# Altium footprint library boxer_ic.PcbLib: 42 footprints (part 1 of 3)
Each footprint in its own frame and in the unit in brackets; x right, y up, seen from the top. Pads: shape width x height; smd on the part's side, far side on the other; paste and mask are expansions set on the pad; w line width, h text height; cw(c..) or ccw(c..) is an arc to the next point about the centre after c.
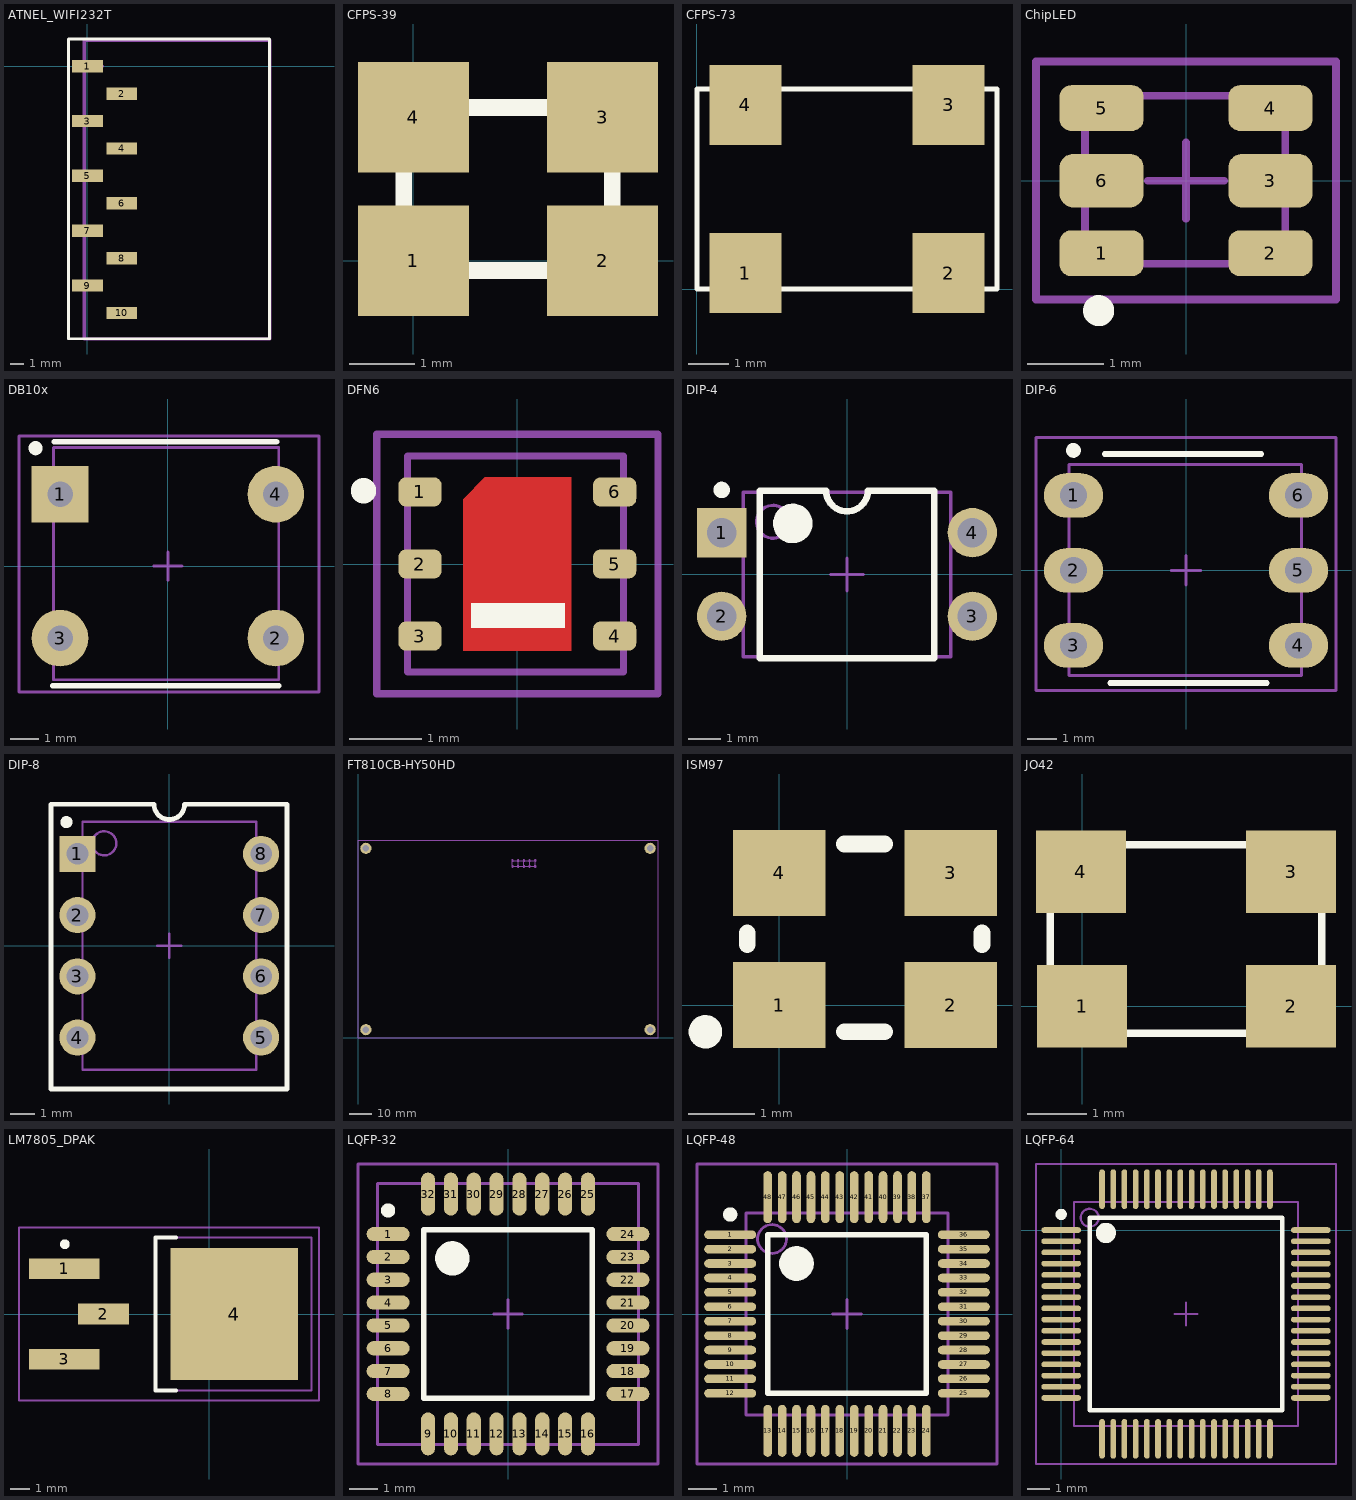
[diagram p0: the footprints below, top view; thin cyan lines are the x and y axes]

## ATNEL_WIFI232T [mm]
height 6
pads (10):
  rect 2.25x0.9 smd: 1(0,0) 2(2.515,-2) 3(0,-4) 4(2.515,-6) 5(0,-8) 6(2.515,-10) 7(0,-12) 8(2.515,-14) 9(0,-16) 10(2.515,-18)
Top Overlay:
  lines w0.2: -1.376,-19.888 13.28,-19.888 13.28,1.981 -1.376,1.981 -1.376,-19.888
Mechanical 13:
  lines w0.2: -0.212,0 1.118,0
  lines w0.254: -0.212,-16.002 -0.212,-19.9 ; -0.212,-19.9 13.288,-19.9 13.288,1.9 -0.212,1.9 -0.212,-19.9
3D body "mill-max-830-10-010-30-001000.STEP": height 8.61, standoff 0.2, extent -1.009,-18.928 3.429,1.072

## CFPS-39 [mm]
pads (4):
  rect 1.7x1.7 smd: 1(0,0) 2(2.9,0) 3(2.9,2.2) 4(0,2.2)
Top Overlay:
  circle w0.254: c-0.549,-0.513 r0.127
  lines w0.254: -0.15,-0.15 -0.15,2.35 3.05,2.35 3.05,-0.15 -0.15,-0.15
3D body: height 1.75, standoff 0, extent -0.152,-0.152 3.048,2.362

## CFPS-73 [mm]
pads (4):
  rect 1.8x2 smd: 1(1.219,0.406) 2(6.299,0.406) 3(6.299,4.606) 4(1.219,4.606)
Top Overlay:
  lines w0.127: 0.009,0.006 7.509,0.006 7.509,5.006 0.009,5.006 0.009,0.006

## ChipLED [mm]
height 1.5
pads (6):
  rrect50% 1.1x0.6 smd: 1(-1.105,-0.95) 2(1.105,-0.95) 4(1.105,0.95) 5(-1.105,0.95)
  rrect50% 1.1x0.7 smd: 3(1.105,0) 6(-1.105,0)
Top Overlay:
  circle w0.254: c-1.143,-1.702 r0.076
Mechanical 13:
  lines w0.1: -1.323,-1.09 -1.323,1.11 1.297,1.11 1.297,-1.09 -1.323,-1.09
  text ".Designator" at -1.27,1.448 h0.5
  text ".Value" at -0.914,-1.854 h0.5
Mechanical 15:
  lines w0.1: -0.5,0 0.5,0 ; 0,-0.5 0,0.5 ; -1.964,-1.555 1.964,-1.555 1.964,1.56 -1.964,1.56 -1.964,-1.555
3D body "User Library-APDS-9301.step": height -0.38, standoff -0.94, extent -1.323,-1.09 1.297,1.11

## DB10x [mm]
height 5.46
pads (4):
  rect 2x2 hole 0.9: 1(-3.81,2.54)
  round 2 hole 0.9: 2(3.81,-2.54) 3(-3.81,-2.54) 4(3.81,2.54)
Top Overlay:
  circle w0.25: c-4.674,4.166 r0.125
  lines w0.2: -4.064,-4.216 3.912,-4.216 ; -4.013,4.394 -0.635,4.394 3.835,4.394
Mechanical 13:
  lines w0.1: -4.039,-4.013 -4.039,4.191 3.912,4.191 3.912,-4.013 -4.039,-4.013
  text ".Value" at -0.965,-0.178 h0.5
  text ".Designator" at -3.958,4.563 h0.5
Mechanical 15:
  lines w0.1: -0.5,0 0.5,0 ; 0,-0.5 0,0.5 ; -5.258,-4.445 5.334,-4.445 5.334,4.597 -5.258,4.597 -5.258,-4.445
3D body "User Library-Silicon Bridge Rectifiers DF01.step": height 3.35, standoff -3.46, extent -4.008,-3.998 3.912,4.202

## DFN6 [mm] "body 3x3mm"
height 2
pads (6):
  rrect50% 0.6x0.4 smd: 1(-1.35,1) 2(-1.35,0) 3(-1.35,-1) 4(1.35,-1) 5(1.35,0) 6(1.35,1)
Top Layer:
  region: 0.75,-1.2 -0.75,-1.2 -0.75,0.9 -0.45,1.2 0.75,1.2
Top Overlay:
  circle w0.2: c-2.134,1.016 r0.076
  rectangle: -0.64,-0.889 0.66,-0.539
Mechanical 13:
  lines w0.1: -1.524,-1.499 -1.524,1.499 1.473,1.499 1.473,-1.499 -1.524,-1.499
  text ".Value" at -0.991,-2.21 h0.5
  text ".Designator" at -1.549,1.829 h0.5
Mechanical 15:
  lines w0.1: -0.5,0 0.5,0 ; 0,-0.5 0,0.5 ; -1.951,-1.799 -1.951,1.799 1.951,1.799 1.951,-1.799 -1.951,-1.799
3D body "User Library-SHT25.step": height 1, standoff 0, extent -1.501,-1.499 1.499,1.501

## DIP-4 [mm] "DIP; 4 Leads; Row Spacing 7.62 mm; Pitch 2.54 mm"
height 5.6
pads (4):
  rect 1.5x1.5 hole 0.9: 1(-3.81,1.27)
  round 1.5 hole 0.9: 2(-3.81,-1.27) 3(3.81,-1.27) 4(3.81,1.27)
Top Overlay:
  circle w0.25: c-3.81,2.57 r0.125
  circle w0.6: c-1.65,1.55 r0.3
  lines w0.2: -2.65,-2.55 -2.65,2.55 -0.635,2.55 ccw(c0,2.55) 0.635,2.55 2.65,2.55 2.65,-2.55 -2.65,-2.55
Mechanical 13:
  circle w0.1: c-2.25,1.6 r0.5
  lines w0.1: -3.15,-2.5 -3.15,2.5 3.15,2.5 3.15,-2.5 -3.15,-2.5
Mechanical 15:
  lines w0.1: -0.5,0 0.5,0 ; 0,-0.5 0,0.5
3D body "CircuitWorks-DIP4.step": height 4.31, standoff -3.28, extent -4,-2.769 4,2.771

## DIP-6 [mm] "DIP; 6 Leads; Row Spacing 7.62 mm; Pitch 2.54 mm"
height 5.46
pads (6):
  oval 2x1.5 hole 0.9: 1(-3.81,2.54) 2(-3.81,0) 3(-3.81,-2.54) 4(3.81,-2.54) 5(3.81,0) 6(3.81,2.54)
Top Overlay:
  circle w0.25: c-3.81,4.064 r0.125
  lines w0.2: -2.752,3.937 0.533,3.937 2.548,3.937 ; -2.565,-3.81 2.735,-3.81
Mechanical 13:
  lines w0.1: -3.962,-3.556 -3.962,3.581 3.912,3.581 3.912,-3.556 -3.962,-3.556
Mechanical 15:
  lines w0.1: -0.5,0 0.5,0 ; 0,-0.5 0,0.5 ; -5.08,-4.064 5.08,-4.064 5.08,4.496 -5.08,4.496 -5.08,-4.064
3D body "User Library-DIP6-White.STEP": height 4.4, standoff -2.9, extent -3.96,-3.531 3.91,3.589

## DIP-8 [mm] "DIP; 8 Leads; Row Spacing 7.62 mm; Pitch 2.54 mm"
height 5.08
pads (8):
  rect 1.5x1.5 hole 0.9: 1(-3.81,3.81)
  round 1.5 hole 0.9: 2(-3.81,1.27) 3(-3.81,-1.27) 4(-3.81,-3.81) 5(3.81,-3.81) 6(3.81,-1.27) 7(3.81,1.27) 8(3.81,3.81)
Top Overlay:
  circle w0.25: c-4.267,5.131 r0.125
  lines w0.2: -4.902,-5.944 4.877,-5.944 4.877,5.867 0.635,5.867 cw(c0,5.867) -0.635,5.867 -4.902,5.867 -4.902,-5.944
Mechanical 13:
  circle w0.1: c-2.7,4.25 r0.5
  lines w0.1: -3.6,-5.15 3.6,-5.15 3.6,5.15 -3.6,5.15 -3.6,-5.15
Mechanical 15:
  lines w0.1: -0.5,0 0.5,0 ; 0,-0.5 0,0.5
3D body "CircuitWorks-DIP8.step": height 4.19, standoff -2.67, extent -3.912,-5.715 3.962,5.715

## FT810CB-HY50HD [mm]
height 10
pads (4):
  round 5 hole 3: MH1(130.5,3.5) MH2(130.5,84.5) MH3(3.5,3.5) MH4(3.5,84.5)
Mechanical 1:
  circle w0.1: c79.16,76.46 r0.368
  circle w0.1: c76.62,76.46 r0.368
  circle w0.1: c74.08,76.46 r0.368
  circle w0.1: c71.54,76.46 r0.368
  circle w0.1: c69,76.46 r0.368
  circle w0.1: c69,79 r0.368
  circle w0.1: c71.54,79 r0.368
  circle w0.1: c74.08,79 r0.368
  circle w0.1: c76.62,79 r0.368
  circle w0.1: c79.16,79 r0.368
  lines w0.1: 0,79 0,88 ; 71.54,76.46 71.54,79 ; 74.08,76.46 74.08,79 ; 76.62,76.46 76.62,79 ; 0,88 134,88 134,0 0,0 0,88 ; 69,76.46 69,79 79.16,79 79.16,76.46 69,76.46

## ISM97 [mm]
pads (4):
  rect 1.4x1.3 smd: 1(0,0) 2(2.6,0) 3(2.6,2) 4(0,2)
Top Overlay:
  circle w0.254: c-1.118,-0.406 r0.127
  lines w0.254: -0.483,0.914 -0.483,1.092 ; 0.991,-0.406 1.6,-0.406 ; 0.991,2.438 1.6,2.438 ; 3.073,0.914 3.073,1.092
3D body "User Library-SG310.step": height 1.05, standoff 0, extent -0.305,-0.239 2.895,2.261

## JO42 [mil]
pads (4):
  rect 60x55 smd: 1(0,0) 2(139.3,0) 3(139.3,89.72) 4(-0.79,89.72)
Top Overlay:
  lines w5: -21.24,-18.11 159.86,-18.11 159.86,107.88 -21.24,107.88 -21.24,-18.11

## LM7805_DPAK [mm] "Single-Ended SM Package, 3-Leads, Body 10.9x7.6mm, Pitch 2.3mm,"
height 2.7
pads (4):
  rect 3.6x1.05 smd: 1(-7.4,2.3) 3(-7.4,-2.3)
  rect 2.6x1.05 smd: 2(-5.4,0)
  rect 6.5x6.75 smd: 4(1.27,0)
Top Overlay:
  circle w0.25: c-7.364,3.556 r0.125
  lines w0.2: -1.7,-3.9 -2.75,-3.9 -2.75,3.9 -1.7,3.9
Mechanical 13:
  lines w0.1: -2.75,-3.9 5.207,-3.9 5.207,-3.101 5.207,-1.102 5.207,-0.127 5.207,0.127 5.207,1.102 5.207,3.9 -2.75,3.9 -2.75,-3.9
Mechanical 15:
  lines w0.1: -0.5,0 0.5,0 ; 0,-0.5 0,0.5 ; -9.7,-4.4 -9.7,4.4 5.588,4.4 5.588,-4.4 -9.7,-4.4

## LQFP-32 [mm] "Thin QFP, 32-Leads, Body 7x7mm, Pitch 0.8mm, IPC Medium Density"
height 1.6
pads (32):
  oval 1.5x0.5 smd: 1(-4.2,2.8) 2(-4.2,2) 3(-4.2,1.2) 4(-4.2,0.4) 5(-4.2,-0.4) 6(-4.2,-1.2) 7(-4.2,-2) 8(-4.2,-2.8) 17(4.2,-2.8) 18(4.2,-2) 19(4.2,-1.2) 20(4.2,-0.4) 21(4.2,0.4) 22(4.2,1.2) 23(4.2,2) 24(4.2,2.8)
  oval 0.5x1.5 smd: 9(-2.8,-4.2) 10(-2,-4.2) 11(-1.2,-4.2) 12(-0.4,-4.2) 13(0.4,-4.2) 14(1.2,-4.2) 15(2,-4.2) 16(2.8,-4.2) 25(2.8,4.2) 26(2,4.2) 27(1.2,4.2) 28(0.4,4.2) 29(-0.4,4.2) 30(-1.2,4.2) 31(-2,4.2) 32(-2.8,4.2)
Top Overlay:
  circle w0.6: c-1.95,1.95 r0.3
  circle w0.25: c-4.2,3.625 r0.125
  lines w0.2: -2.95,-2.95 2.95,-2.95 2.95,2.95 -2.95,2.95 -2.95,-2.95
Mechanical 13:
  lines w0.1: -4.572,-4.572 -4.572,4.572 4.572,4.572 4.572,-4.572 -4.572,-4.572
  text ".Value" at -1.016,-0.127 h0.5
  text ".Designator" at -1.93,4.902 h0.5
Mechanical 15:
  lines w0.1: -0.5,0 0.5,0 ; 0,-0.5 0,0.5 ; -5.253,-5.253 5.253,-5.253 5.253,5.253 -5.253,5.253 -5.253,-5.253
3D body "User Library-LQFP32-2.STEP": height 1.62, standoff -0.01, extent -4.572,-4.572 4.572,4.572

## LQFP-48 [mm] "Thin QFP, 48-Leads, Body 7x7mm, Pitch 0.5mm, IPC Medium Density"
height 1.6
pads (48):
  oval 1.8x0.3 smd: 1(-4.05,2.75) 2(-4.05,2.25) 3(-4.05,1.75) 4(-4.05,1.25) 5(-4.05,0.75) 6(-4.05,0.25) 7(-4.05,-0.25) 8(-4.05,-0.75) 9(-4.05,-1.25) 10(-4.05,-1.75) 11(-4.05,-2.25) 12(-4.05,-2.75) 25(4.05,-2.75) 26(4.05,-2.25) 27(4.05,-1.75) 28(4.05,-1.25) 29(4.05,-0.75) 30(4.05,-0.25) 31(4.05,0.25) 32(4.05,0.75) 33(4.05,1.25) 34(4.05,1.75) 35(4.05,2.25) 36(4.05,2.75)
  oval 0.3x1.8 smd: 13(-2.75,-4.05) 14(-2.25,-4.05) 15(-1.75,-4.05) 16(-1.25,-4.05) 17(-0.75,-4.05) 18(-0.25,-4.05) 19(0.25,-4.05) 20(0.75,-4.05) 21(1.25,-4.05) 22(1.75,-4.05) 23(2.25,-4.05) 24(2.75,-4.05) 37(2.75,4.05) 38(2.25,4.05) 39(1.75,4.05) 40(1.25,4.05) 41(0.75,4.05) 42(0.25,4.05) 43(-0.25,4.05) 44(-0.75,4.05) 45(-1.25,4.05) 46(-1.75,4.05) 47(-2.25,4.05) 48(-2.75,4.05)
Top Overlay:
  circle w0.25: c-4.05,3.45 r0.125
  circle w0.6: c-1.75,1.75 r0.3
  lines w0.2: -2.75,-2.75 -2.75,2.75 2.75,2.75 2.75,-2.75 -2.75,-2.75
Mechanical 13:
  circle w0.1: c-2.6,2.6 r0.5
  lines w0.1: -3.5,-3.5 -3.5,3.5 3.5,3.5 3.5,-3.5 -3.5,-3.5
  text ".Designator" at -1.753,4.013 h0.5
  text ".Value" at -1.016,-0.178 h0.5
Mechanical 15:
  lines w0.1: -0.5,0 0.5,0 ; 0,-0.5 0,0.5 ; -5.2,-5.2 -5.2,5.2 5.2,5.2 5.2,-5.2 -5.2,-5.2
3D body: height 1.6, standoff 0, extent -3.5,-3.5 3.5,3.5

## LQFP-64 [mm] "64-Pin LQFP 0.5 mm Pitch"
height 1.6
pads (64):
  oval 1.778x0.25 smd mask+0.076: 1(0,0) 2(0,-0.5) 3(0,-1) 4(0,-1.5) 5(0,-2) 6(0,-2.5) 7(0,-3) 8(0,-3.5) 9(0,-4) 10(0,-4.5) 11(0,-5) 12(0,-5.5) 13(0,-6) 14(0,-6.5) 15(0,-7) 16(0,-7.5) 33(11.15,-7.5) 34(11.15,-7) 35(11.15,-6.5) 36(11.15,-6) 37(11.15,-5.5) 38(11.15,-5) 39(11.15,-4.5) 40(11.15,-4) 41(11.15,-3.5) 42(11.15,-3) 43(11.15,-2.5) 44(11.15,-2) 45(11.15,-1.5) 46(11.15,-1) 47(11.15,-0.5) 48(11.15,0)
  oval 0.25x1.778 smd mask+0.076: 17(1.825,-9.325) 18(2.325,-9.325) 19(2.825,-9.325) 20(3.325,-9.325) 21(3.825,-9.325) 22(4.325,-9.325) 23(4.825,-9.325) 24(5.325,-9.325) 25(5.825,-9.325) 26(6.325,-9.325) 27(6.825,-9.325) 28(7.325,-9.325) 29(7.825,-9.325) 30(8.325,-9.325) 31(8.825,-9.325) 32(9.325,-9.325) 49(9.325,1.825) 50(8.825,1.825) 51(8.325,1.825) 52(7.825,1.825) 53(7.325,1.825) 54(6.825,1.825) 55(6.325,1.825) 56(5.825,1.825) 57(5.325,1.825) 58(4.825,1.825) 59(4.325,1.825) 60(3.825,1.825) 61(3.325,1.825) 62(2.825,1.825) 63(2.325,1.825) 64(1.825,1.825)
Top Overlay:
  circle w0.6: c1.995,-0.13 r0.15
  circle w0.25: c0,0.7 r0.125
  lines w0.2: 1.275,-8.05 9.875,-8.05 9.875,0.55 1.275,0.55 1.275,-8.05
Mechanical 13:
  circle w0.1: c1.275,0.55 r0.4
  lines w0.1: 0.575,-8.75 10.575,-8.75 10.575,1.25 0.575,1.25 0.575,-8.75
  text ".Value" at 4.597,-4.039 h0.5
  text ".Designator" at 3.734,1.6 h0.5
Mechanical 15:
  lines w0.1: 5.075,-3.75 6.075,-3.75 ; 5.575,-4.25 5.575,-3.25 ; -1.125,-10.45 12.275,-10.45 12.275,2.95 -1.125,2.95 -1.125,-10.45
3D body "User Library-lqpf64.step": height 1.5, standoff 0.02, extent -0.425,-9.75 11.575,2.25